# Altium footprint library General.PcbLib: 446 footprints (part 11 of 28)
Each footprint in its own frame and in the unit in brackets; x right, y up, seen from the top. Pads: shape width x height; smd on the part's side, far side on the other; paste and mask are expansions set on the pad; w line width, h text height; cw(c..) or ccw(c..) is an arc to the next point about the centre after c.
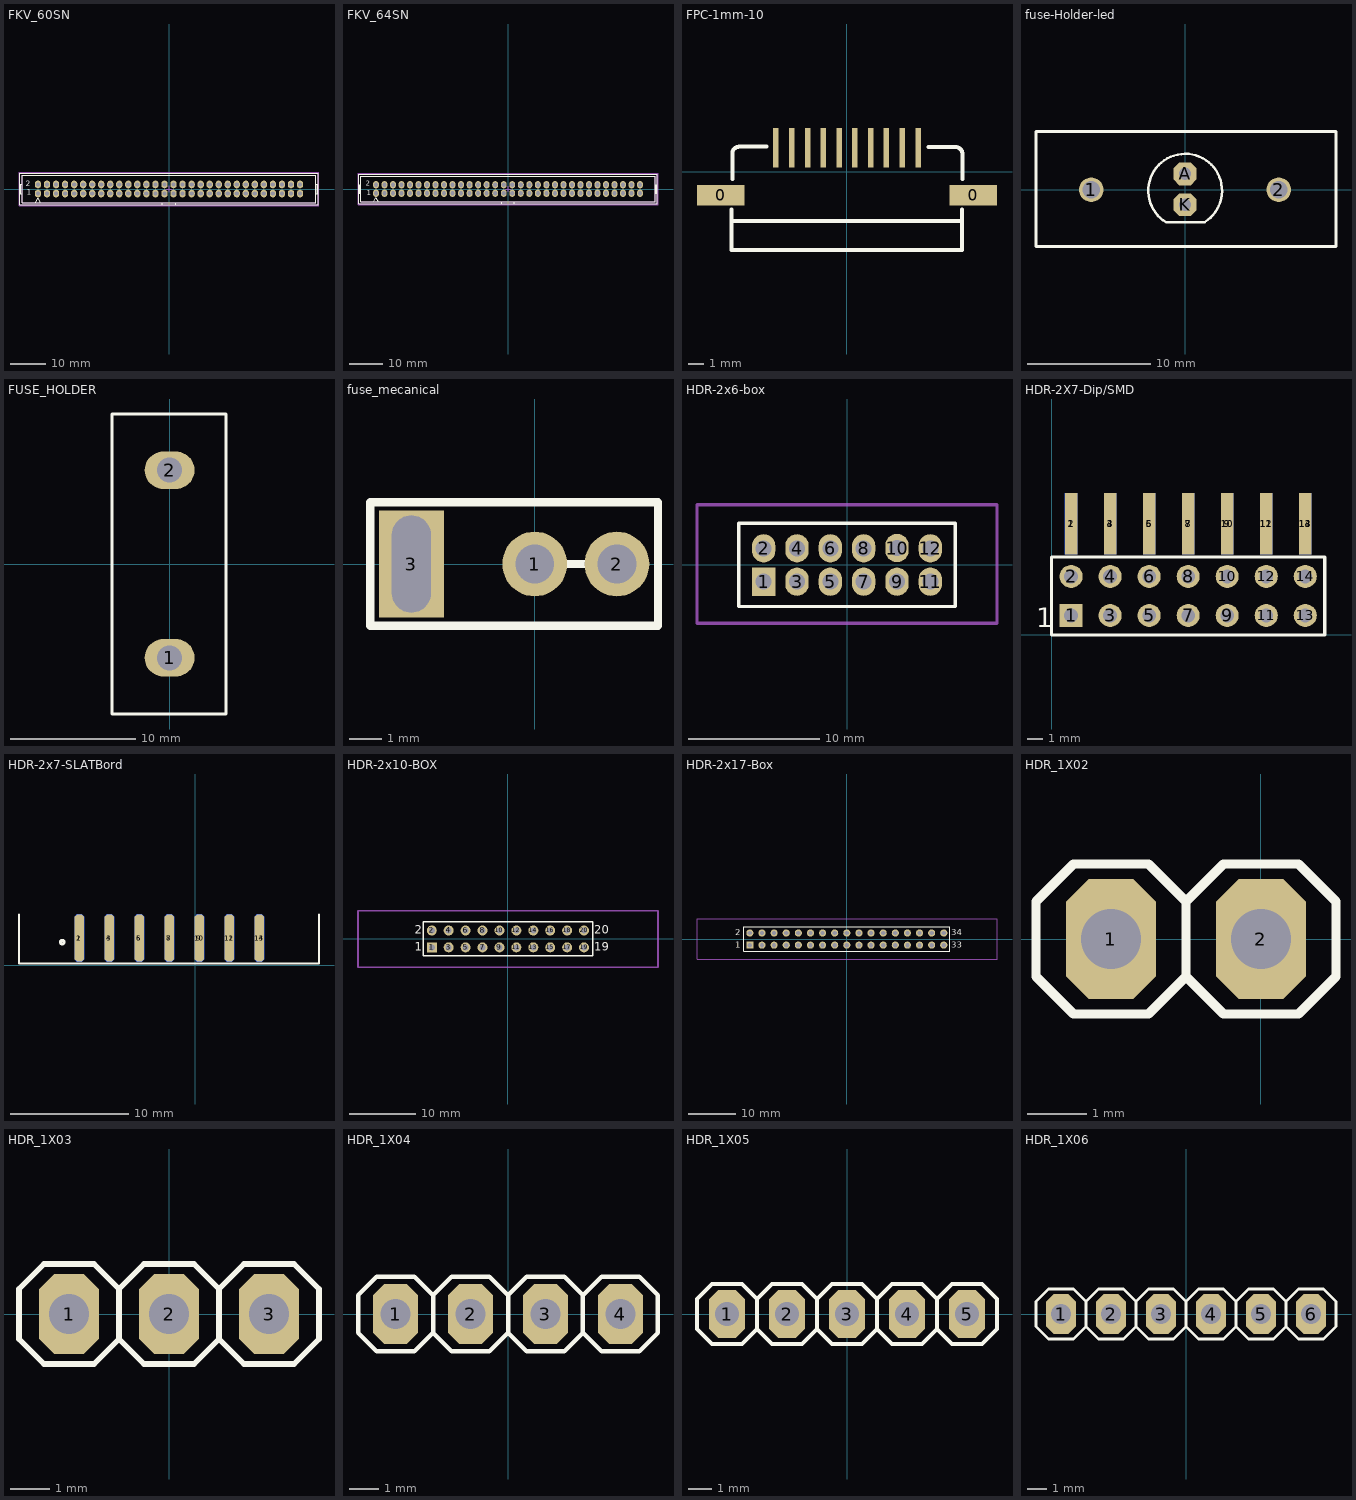
[diagram p10: the footprints below, top view; thin cyan lines are the x and y axes]

## FKV_60SN [mil] "Connector; BoxHeader; 30x2 Position ,2.54mm Pitch"
height 346.46
pads (60):
  oval 70x85 hole 48: 1(-1450,-50) 2(-1450,50) 3(-1350,-50) 4(-1350,50) 5(-1250,-50) 6(-1250,50) 7(-1150,-50) 8(-1150,50) 9(-1050,-50) 10(-1050,50) 11(-950,-50) 12(-950,50) 13(-850,-50) 14(-850,50) 15(-750,-50) 16(-750,50) 17(-650,-50) 18(-650,50) 19(-550,-50) 20(-550,50) 21(-450,-50) 22(-450,50) 23(-350,-50) 24(-350,50) 25(-250,-50) 26(-250,50) 27(-150,-50) 28(-150,50) 29(-50,-50) 30(-50,50) 31(50,-50) 32(50,50) 33(150,-50) 34(150,50) 35(250,-50) 36(250,50) 37(350,-50) 38(350,50) 39(450,-50) 40(450,50) 41(550,-50) 42(550,50) 43(650,-50) 44(650,50) 45(750,-50) 46(750,50) 47(850,-50) 48(850,50) 49(950,-50) 50(950,50) 51(1050,-50) 52(1050,50) 53(1150,-50) 54(1150,50) 55(1250,-50) 56(1250,50) 57(1350,-50) 58(1350,50) 59(1450,-50) 60(1450,50)
Top Overlay:
  lines w8: -1650,-50 -1625,-50 ; -1650,50 -1625,50 ; -1641.67,-50 -1641.67,50 ; -1475,-150 -1450,-100 -1425,-150 ; -75,-175 -75,-150 ; 75,-175 75,-150 ; 1625,-50 1650,-50 ; 1625,50 1650,50 ; 1641.67,-50 1641.67,50 ; -75,-150 75,-150 ; -75,-150 -1625,-150 -1625,150 1625,150 1625,-150 75,-150 ; -1650,-175 1650,-175 1650,175 -1650,175 -1650,-175
  text "1" at -1576,-66 h60
  text "2" at -1585,32 h60
Mechanical 13:
  drawing of 492 lines, arcs and shapes, not listed
Mechanical 15:
  lines w3.94: -35,0 0,0 ; 0,-35 0,0 ; 0,35 0,0 ; 35,0 0,0 ; -1660,-185 -1660,185 1660,185 1660,-185 -1660,-185
3D body: height 314.96, standoff -129.92, extent 1037.52,-62.48 1062.48,-37.52
3D body: height 314.96, standoff -129.92, extent 1137.52,-62.48 1162.48,-37.52
3D body: height 314.96, standoff -129.92, extent 1137.52,37.52 1162.48,62.48
3D body: height 314.96, standoff -129.92, extent 1037.52,37.52 1062.48,62.48
3D body: height 314.96, standoff -129.92, extent 1237.52,-62.48 1262.48,-37.52
3D body: height 314.96, standoff -129.92, extent 1337.52,-62.48 1362.48,-37.52
3D body: height 314.96, standoff -129.92, extent 1337.52,37.52 1362.48,62.48
3D body: height 314.96, standoff -129.92, extent 1237.52,37.52 1262.48,62.48
3D body: height 314.96, standoff -129.92, extent 1437.52,-62.48 1462.48,-37.52
3D body: height 314.96, standoff -129.92, extent 1437.52,37.52 1462.48,62.48
3D body: height 314.96, standoff -129.92, extent 537.52,-62.48 562.48,-37.52
3D body: height 314.96, standoff -129.92, extent 637.52,-62.48 662.48,-37.52
3D body: height 314.96, standoff -129.92, extent 637.52,37.52 662.48,62.48
3D body: height 314.96, standoff -129.92, extent 537.52,37.52 562.48,62.48
3D body: height 314.96, standoff -129.92, extent 737.52,-62.48 762.48,-37.52
3D body: height 314.96, standoff -129.92, extent 837.52,-62.48 862.48,-37.52
3D body: height 314.96, standoff -129.92, extent 837.52,37.52 862.48,62.48
3D body: height 314.96, standoff -129.92, extent 737.52,37.52 762.48,62.48
3D body: height 314.96, standoff -129.92, extent 937.52,-62.48 962.48,-37.52
3D body: height 314.96, standoff -129.92, extent 937.52,37.52 962.48,62.48
3D body: height 314.96, standoff -129.92, extent 37.52,-62.48 62.48,-37.52
3D body: height 314.96, standoff -129.92, extent 137.52,-62.48 162.48,-37.52
3D body: height 314.96, standoff -129.92, extent 137.52,37.52 162.48,62.48
3D body: height 314.96, standoff -129.92, extent 37.52,37.52 62.48,62.48
3D body: height 314.96, standoff -129.92, extent 237.52,-62.48 262.48,-37.52
3D body: height 314.96, standoff -129.92, extent 337.52,-62.48 362.48,-37.52
3D body: height 314.96, standoff -129.92, extent 337.52,37.52 362.48,62.48
3D body: height 314.96, standoff -129.92, extent 237.52,37.52 262.48,62.48
3D body: height 314.96, standoff -129.92, extent 437.52,-62.48 462.48,-37.52
3D body: height 314.96, standoff -129.92, extent 437.52,37.52 462.48,62.48
3D body: height 314.96, standoff -129.92, extent -462.48,-62.48 -437.52,-37.52
3D body: height 314.96, standoff -129.92, extent -362.48,-62.48 -337.52,-37.52
3D body: height 314.96, standoff -129.92, extent -362.48,37.52 -337.52,62.48
3D body: height 314.96, standoff -129.92, extent -462.48,37.52 -437.52,62.48
3D body: height 314.96, standoff -129.92, extent -262.48,-62.48 -237.52,-37.52
3D body: height 314.96, standoff -129.92, extent -162.48,-62.48 -137.52,-37.52
3D body: height 314.96, standoff -129.92, extent -162.48,37.52 -137.52,62.48
3D body: height 314.96, standoff -129.92, extent -262.48,37.52 -237.52,62.48
3D body: height 314.96, standoff -129.92, extent -62.48,-62.48 -37.52,-37.52
3D body: height 314.96, standoff -129.92, extent -62.48,37.52 -37.52,62.48
3D body: height 314.96, standoff -129.92, extent -962.48,-62.48 -937.52,-37.52
3D body: height 314.96, standoff -129.92, extent -862.48,-62.48 -837.52,-37.52
3D body: height 314.96, standoff -129.92, extent -862.48,37.52 -837.52,62.48
3D body: height 314.96, standoff -129.92, extent -962.48,37.52 -937.52,62.48
3D body: height 314.96, standoff -129.92, extent -762.48,-62.48 -737.52,-37.52
3D body: height 314.96, standoff -129.92, extent -662.48,-62.48 -637.52,-37.52
3D body: height 314.96, standoff -129.92, extent -662.48,37.52 -637.52,62.48
3D body: height 314.96, standoff -129.92, extent -762.48,37.52 -737.52,62.48
3D body: height 314.96, standoff -129.92, extent -562.48,-62.48 -537.52,-37.52
3D body: height 314.96, standoff -129.92, extent -562.48,37.52 -537.52,62.48
3D body: height 314.96, standoff -129.92, extent -1462.48,-62.48 -1437.52,-37.52
3D body: height 314.96, standoff -129.92, extent -1362.48,-62.48 -1337.52,-37.52
3D body: height 314.96, standoff -129.92, extent -1362.48,37.52 -1337.52,62.48
3D body: height 314.96, standoff -129.92, extent -1462.48,37.52 -1437.52,62.48
3D body: height 314.96, standoff -129.92, extent -1262.48,-62.48 -1237.52,-37.52
3D body: height 314.96, standoff -129.92, extent -1162.48,-62.48 -1137.52,-37.52
3D body: height 314.96, standoff -129.92, extent -1162.48,37.52 -1137.52,62.48
3D body: height 314.96, standoff -129.92, extent -1262.48,37.52 -1237.52,62.48
3D body: height 314.96, standoff -129.92, extent -1062.48,-62.48 -1037.52,-37.52
3D body: height 314.96, standoff -129.92, extent -1062.48,37.52 -1037.52,62.48
3D body: height 346.46, standoff 0, extent -1649.98,-174.98 1649.98,174.98
3D body: height 78.74, standoff 0, extent -1624.98,-149.98 1624.98,149.98
3D body: height 118.11, standoff 0, extent -74.98,-174.98 74.98,-150.02

## FKV_64SN [mil] "Connector; BoxHeader; 32x2 Position ,2.54mm Pitch"
height 346.46
pads (64):
  oval 70x85 hole 48: 1(-1550,-50) 2(-1550,50) 3(-1450,-50) 4(-1450,50) 5(-1350,-50) 6(-1350,50) 7(-1250,-50) 8(-1250,50) 9(-1150,-50) 10(-1150,50) 11(-1050,-50) 12(-1050,50) 13(-950,-50) 14(-950,50) 15(-850,-50) 16(-850,50) 17(-750,-50) 18(-750,50) 19(-650,-50) 20(-650,50) 21(-550,-50) 22(-550,50) 23(-450,-50) 24(-450,50) 25(-350,-50) 26(-350,50) 27(-250,-50) 28(-250,50) 29(-150,-50) 30(-150,50) 31(-50,-50) 32(-50,50) 33(50,-50) 34(50,50) 35(150,-50) 36(150,50) 37(250,-50) 38(250,50) 39(350,-50) 40(350,50) 41(450,-50) 42(450,50) 43(550,-50) 44(550,50) 45(650,-50) 46(650,50) 47(750,-50) 48(750,50) 49(850,-50) 50(850,50) 51(950,-50) 52(950,50) 53(1050,-50) 54(1050,50) 55(1150,-50) 56(1150,50) 57(1250,-50) 58(1250,50) 59(1350,-50) 60(1350,50) 61(1450,-50) 62(1450,50) 63(1550,-50) 64(1550,50)
Top Overlay:
  lines w8: -1750,-50 -1725,-50 ; -1750,50 -1725,50 ; -1741.67,-50 -1741.67,50 ; -1575,-150 -1550,-100 -1525,-150 ; -75,-175 -75,-150 ; 75,-175 75,-150 ; 1725,-50 1750,-50 ; 1725,50 1750,50 ; 1741.67,-50 1741.67,50 ; -75,-150 -1725,-150 -1725,150 1725,150 1725,-150 75,-150 ; -75,-150 75,-150 ; -1750,-175 -1750,175 1750,175 1750,-175 -1750,-175
  text "2" at -1669,41 h60
  text "1" at -1660,-76 h60
Mechanical 13:
  drawing of 524 lines, arcs and shapes, not listed
Mechanical 15:
  lines w3.94: -30,0 0,0 ; 0,-30 0,0 ; 0,30 0,0 ; 30,0 0,0 ; -1760,-185 1760,-185 1760,185 -1760,185 -1760,-185
3D body: height 118.11, standoff 0, extent -74.98,-174.98 74.98,-150.02
3D body: height 78.74, standoff 0, extent -1724.98,-149.98 1724.98,149.98
3D body: height 346.46, standoff 0, extent -1749.98,-174.98 1749.98,174.98
3D body: height 314.96, standoff -129.92, extent -1562.48,-62.48 -1537.52,-37.52
3D body: height 314.96, standoff -129.92, extent -1462.48,-62.48 -1437.52,-37.52
3D body: height 314.96, standoff -129.92, extent -1462.48,37.52 -1437.52,62.48
3D body: height 314.96, standoff -129.92, extent -1562.48,37.52 -1537.52,62.48
3D body: height 314.96, standoff -129.92, extent -1362.48,-62.48 -1337.52,-37.52
3D body: height 314.96, standoff -129.92, extent -1262.48,-62.48 -1237.52,-37.52
3D body: height 314.96, standoff -129.92, extent -1262.48,37.52 -1237.52,62.48
3D body: height 314.96, standoff -129.92, extent -1362.48,37.52 -1337.52,62.48
3D body: height 314.96, standoff -129.92, extent -1162.48,-62.48 -1137.52,-37.52
3D body: height 314.96, standoff -129.92, extent -1062.48,-62.48 -1037.52,-37.52
3D body: height 314.96, standoff -129.92, extent -1062.48,37.52 -1037.52,62.48
3D body: height 314.96, standoff -129.92, extent -1162.48,37.52 -1137.52,62.48
3D body: height 314.96, standoff -129.92, extent -962.48,-62.48 -937.52,-37.52
3D body: height 314.96, standoff -129.92, extent -862.48,-62.48 -837.52,-37.52
3D body: height 314.96, standoff -129.92, extent -862.48,37.52 -837.52,62.48
3D body: height 314.96, standoff -129.92, extent -962.48,37.52 -937.52,62.48
3D body: height 314.96, standoff -129.92, extent -762.48,-62.48 -737.52,-37.52
3D body: height 314.96, standoff -129.92, extent -662.48,-62.48 -637.52,-37.52
3D body: height 314.96, standoff -129.92, extent -662.48,37.52 -637.52,62.48
3D body: height 314.96, standoff -129.92, extent -762.48,37.52 -737.52,62.48
3D body: height 314.96, standoff -129.92, extent -562.48,-62.48 -537.52,-37.52
3D body: height 314.96, standoff -129.92, extent -462.48,-62.48 -437.52,-37.52
3D body: height 314.96, standoff -129.92, extent -462.48,37.52 -437.52,62.48
3D body: height 314.96, standoff -129.92, extent -562.48,37.52 -537.52,62.48
3D body: height 314.96, standoff -129.92, extent -362.48,-62.48 -337.52,-37.52
3D body: height 314.96, standoff -129.92, extent -262.48,-62.48 -237.52,-37.52
3D body: height 314.96, standoff -129.92, extent -262.48,37.52 -237.52,62.48
3D body: height 314.96, standoff -129.92, extent -362.48,37.52 -337.52,62.48
3D body: height 314.96, standoff -129.92, extent -162.48,-62.48 -137.52,-37.52
3D body: height 314.96, standoff -129.92, extent -62.48,-62.48 -37.52,-37.52
3D body: height 314.96, standoff -129.92, extent -62.48,37.52 -37.52,62.48
3D body: height 314.96, standoff -129.92, extent -162.48,37.52 -137.52,62.48
3D body: height 314.96, standoff -129.92, extent 37.52,-62.48 62.48,-37.52
3D body: height 314.96, standoff -129.92, extent 137.52,-62.48 162.48,-37.52
3D body: height 314.96, standoff -129.92, extent 137.52,37.52 162.48,62.48
3D body: height 314.96, standoff -129.92, extent 37.52,37.52 62.48,62.48
3D body: height 314.96, standoff -129.92, extent 237.52,-62.48 262.48,-37.52
3D body: height 314.96, standoff -129.92, extent 337.52,-62.48 362.48,-37.52
3D body: height 314.96, standoff -129.92, extent 337.52,37.52 362.48,62.48
3D body: height 314.96, standoff -129.92, extent 237.52,37.52 262.48,62.48
3D body: height 314.96, standoff -129.92, extent 437.52,-62.48 462.48,-37.52
3D body: height 314.96, standoff -129.92, extent 537.52,-62.48 562.48,-37.52
3D body: height 314.96, standoff -129.92, extent 537.52,37.52 562.48,62.48
3D body: height 314.96, standoff -129.92, extent 437.52,37.52 462.48,62.48
3D body: height 314.96, standoff -129.92, extent 637.52,-62.48 662.48,-37.52
3D body: height 314.96, standoff -129.92, extent 737.52,-62.48 762.48,-37.52
3D body: height 314.96, standoff -129.92, extent 737.52,37.52 762.48,62.48
3D body: height 314.96, standoff -129.92, extent 637.52,37.52 662.48,62.48
3D body: height 314.96, standoff -129.92, extent 837.52,-62.48 862.48,-37.52
3D body: height 314.96, standoff -129.92, extent 937.52,-62.48 962.48,-37.52
3D body: height 314.96, standoff -129.92, extent 937.52,37.52 962.48,62.48
3D body: height 314.96, standoff -129.92, extent 837.52,37.52 862.48,62.48
3D body: height 314.96, standoff -129.92, extent 1037.52,-62.48 1062.48,-37.52
3D body: height 314.96, standoff -129.92, extent 1137.52,-62.48 1162.48,-37.52
3D body: height 314.96, standoff -129.92, extent 1137.52,37.52 1162.48,62.48
3D body: height 314.96, standoff -129.92, extent 1037.52,37.52 1062.48,62.48
3D body: height 314.96, standoff -129.92, extent 1237.52,-62.48 1262.48,-37.52
3D body: height 314.96, standoff -129.92, extent 1337.52,-62.48 1362.48,-37.52
3D body: height 314.96, standoff -129.92, extent 1337.52,37.52 1362.48,62.48
3D body: height 314.96, standoff -129.92, extent 1237.52,37.52 1262.48,62.48
3D body: height 314.96, standoff -129.92, extent 1437.52,-62.48 1462.48,-37.52
3D body: height 314.96, standoff -129.92, extent 1537.52,-62.48 1562.48,-37.52
3D body: height 314.96, standoff -129.92, extent 1537.52,37.52 1562.48,62.48
3D body: height 314.96, standoff -129.92, extent 1437.52,37.52 1462.48,62.48

## FPC-1mm-10 [mm]
pads (12):
  rect 3x1.3 smd: 0(-8,-1.5) 0(8,-1.5)
  rect 0.35x2.5 smd: 1(-4.5,1.5) 2(-3.5,1.5) 3(-2.5,1.5) 4(-1.5,1.5) 5(-0.5,1.5) 6(0.5,1.5) 7(1.5,1.5) 8(2.5,1.5) 9(3.5,1.5) 10(4.5,1.5)
Top Overlay:
  lines w0.254: -7.315,-3.124 7.29,-3.124 ; -7.315,-2.413 -7.315,-4.953 7.29,-4.953 7.29,-2.413 ; -7.264,-0.457 -7.264,1.143 cw(c-6.833,1.143) -6.833,1.575 -5.105,1.575 ; 5.156,1.549 6.883,1.549 cw(c6.883,1.118) 7.315,1.118 7.315,-0.483
3D body "fpc-10-100-shb-t.stp": height 2.3, standoff 0.05, extent -7.304,-4.954 7.296,1.545

## fuse-Holder-led [mm] "with led"
pads (4):
  round 2 hole 1.4: 1(-7.62,0) 2(7.62,0)
  oct 1.85x1.85 hole 1: A(0,1.292) K(0,-1.208)
Top Overlay:
  lines w0.2: -1.543,-2.639 1.599,-2.621 ccw(c0.01,-0.077) -1.535,-2.648
  lines w0.254: -12.116,-4.623 12.268,-4.623 12.268,4.75 -12.116,4.75 -12.116,-4.623
3D body "Fuse-Holder.stp": height 14, standoff -3, extent -12.098,-4.648 12.302,4.752

## FUSE_HOLDER [mm]
pads (2):
  oval 4x3 hole 2: 1(0,-7.5) 2(0,7.5)
Top Overlay:
  lines w0.254: -4.6,-12 4.5,-12 4.5,12 -4.6,12 -4.6,-12
3D body "SW3dPS-part 8.STEP": height 12.96, standoff -2.9, extent -4.606,-12.031 4.476,11.969

## fuse_mecanical [mm]
pads (3):
  round 2 hole 1.2: 1(0,0) 2(2.54,0)
  rect 2x3.3 hole 1.2 slot 3 at 90 deg: 3(-3.81,0)
Top Overlay:
  lines w0.254: 0,0 2.54,0 ; -5.08,-1.905 -5.08,1.905 3.81,1.905 3.81,-1.905 -5.08,-1.905
3D body "1W right 100mil.step": height 14.83, standoff -2.23, extent -1.736,-1.905 3.006,1.895

## HDR-2x6-box [mil]
pads (12):
  rect 70x85 hole 48: 1(-250,-50.5)
  oval 70x85 hole 48: 2(-250,49.5) 3(-150,-50.5) 4(-150,49.5) 5(-50,-50.5) 6(-50,49.5) 7(50,-50.5) 8(50,49.5) 9(150,-50.5) 10(150,50.5) 11(250,-50.5) 12(250,49.5)
Top Overlay:
  lines w10: -325,-125 325,-125 325,125 -325,125 -325,-125
Mechanical 13:
  lines w3.94: -270,-70.5 -230,-70.5 -230,-30.5 -270,-30.5 -270,-70.5 ; -270,29.5 -270,69.5 -230,69.5 -230,29.5 -270,29.5 ; -170,-70.5 -170,-30.5 -130,-30.5 -130,-70.5 -170,-70.5 ; -170,29.5 -170,69.5 -130,69.5 -130,29.5 -170,29.5 ; -70,-70.5 -30,-70.5 -30,-30.5 -70,-30.5 -70,-70.5 ; -70,29.5 -70,69.5 -30,69.5 -30,29.5 -70,29.5 ; 30,-70.5 30,-30.5 70,-30.5 70,-70.5 30,-70.5 ; 30,29.5 30,69.5 70,69.5 70,29.5 30,29.5 ; 130,-70.5 170,-70.5 170,-30.5 130,-30.5 130,-70.5 ; 130,29.5 130,69.5 170,69.5 170,29.5 130,29.5 ; 230,-70.5 230,-30.5 270,-30.5 270,-70.5 230,-70.5 ; 230,29.5 230,69.5 270,69.5 270,29.5 230,29.5
Mechanical 15:
  lines w10: -450,-175 -450,180 450,180 450,-175 -450,-175
3D body "HeaderBox12.STEP": height 358.27, standoff -118.11, extent -448,-175.77 452,182.5

## HDR-2X7-Dip/SMD [mm] "Connector; Header; 7x2 Position"
pads (28):
  rect 1.5x1.5 hole 0.9: 1(1.27,1.257)
  rect 0.8x4 smd: 1(1.27,7.226) 3(3.81,7.226) 5(6.35,7.226) 7(8.89,7.226) 9(11.43,7.226) 11(13.97,7.226) 13(16.51,7.226)
  round 1.5 hole 0.9: 2(1.27,3.797) 3(3.81,1.257) 4(3.81,3.797) 5(6.35,1.257) 6(6.35,3.797) 7(8.89,1.257) 8(8.89,3.797) 9(11.43,1.257) 10(11.43,3.797) 11(13.97,1.257) 12(13.97,3.797) 13(16.51,1.257) 14(16.51,3.797)
  rect 0.8x4 smd far side: 2(1.27,7.226) 4(3.81,7.226) 6(6.35,7.226) 8(8.89,7.226) 10(11.43,7.226) 12(13.97,7.226) 14(16.51,7.226)
Top Overlay:
  lines w0.2: 0,-0.013 17.78,-0.013 17.78,5.067 0,5.067 0,-0.013
  text "1" at -1.016,0.495 h1.27

## HDR-2x7-SLATBord [mm]
pads (14):
  oct 0.8x4 smd: 1(-9.804,2.299) 3(-7.264,2.299) 5(-4.724,2.299) 7(-2.184,2.299) 9(0.356,2.299) 11(2.896,2.299) 13(5.436,2.299)
  oct 0.8x4 smd far side: 2(-9.804,2.299) 4(-7.264,2.299) 6(-4.724,2.299) 8(-2.184,2.299) 10(0.356,2.299) 12(2.896,2.299) 14(5.436,2.299)
Top Overlay:
  circle w0.254: c-11.252,1.956 r0.152
  lines w0.2: -14.91,4.293 -14.91,0.14 10.49,0.14 10.49,4.293
3D body "6251.stp": height 2.97, standoff -6.08, extent -11.049,-0.082 6.731,13.767

## HDR-2x10-BOX [mm]
pads (20):
  rect 1.5x1.5 hole 0.9: 1(-11.43,-1.27)
  round 1.5 hole 0.9: 2(-11.43,1.27) 3(-8.89,-1.27) 4(-8.89,1.27) 5(-6.35,-1.27) 6(-6.35,1.27) 7(-3.81,-1.27) 8(-3.81,1.27) 9(-1.27,-1.27) 10(-1.27,1.27) 11(1.27,-1.27) 12(1.27,1.27) 13(3.81,-1.27) 14(3.81,1.27) 15(6.35,-1.27) 16(6.35,1.27) 17(8.89,-1.27) 18(8.89,1.27) 19(11.43,-1.27) 20(11.43,1.27)
Top Overlay:
  lines w0.2: -12.7,-2.54 -10.795,-2.54 12.7,-2.54 12.7,2.54 -10.795,2.54 -12.7,2.54 -12.7,-2.54
  text "20" at 12.954,0.762 h1.27
  text "19" at 12.954,-1.778 h1.27
  text "1" at -13.97,-1.778 h1.27
  text "2" at -13.97,0.762 h1.27
Mechanical 15:
  lines w0.254: -22.504,-4.267 22.53,-4.267 22.53,4.242 -22.504,4.242 -22.504,-4.267
3D body "IDC2x17.stp": height 23.39, standoff -3.11, extent -22.494,-4.267 22.506,4.233

## HDR-2x17-Box [mm]
pads (34):
  rect 1.5x1.5 hole 0.9: 1(-20.32,-1.27)
  round 1.5 hole 0.9: 2(-20.32,1.27) 3(-17.78,-1.27) 4(-17.78,1.27) 5(-15.24,-1.27) 6(-15.24,1.27) 7(-12.7,-1.27) 8(-12.7,1.27) 9(-10.16,-1.27) 10(-10.16,1.27) 11(-7.62,-1.27) 12(-7.62,1.27) 13(-5.08,-1.27) 14(-5.08,1.27) 15(-2.54,-1.27) 16(-2.54,1.27) 17(0,-1.27) 18(0,1.27) 19(2.54,-1.27) 20(2.54,1.27) 21(5.08,-1.27) 22(5.08,1.27) 23(7.62,-1.27) 24(7.62,1.27) 25(10.16,-1.27) 26(10.16,1.27) 27(12.7,-1.27) 28(12.7,1.27) 29(15.24,-1.27) 30(15.24,1.27) 31(17.78,-1.27) 32(17.78,1.27) 33(20.32,-1.27) 34(20.32,1.27)
Top Overlay:
  lines w0.2: -21.59,-2.54 -21.59,2.54 21.59,2.54 21.59,-2.54 -21.59,-2.54
  text "2" at -23.368,0.762 h1.27
  text "1" at -23.368,-1.778 h1.27
  text "33" at 21.844,-1.778 h1.27
  text "34" at 21.844,0.762 h1.27
Mechanical 15:
  lines w0.254: -31.394,-4.242 -31.394,4.267 31.471,4.267 31.471,-4.242 -31.344,-4.242 -31.394,-4.242
3D body "IDC2x10.stp": height 23.39, standoff -3.11, extent -31.406,-4.275 31.394,4.225

## HDR_1X02 [mil]
pads (2):
  oct 60x80 hole 40: 1(-100,0) 2(0,0)
Top Overlay:
  rectangle: -10,-10 10,10
  rectangle: -110,-10 -90,10
  lines w6: -50,-25 -50,25 ; -50,-25 -75,-50 -125,-50 -150,-25 -150,25 -125,50 -75,50 -50,25 ; -50,-25 -25,-50 25,-50 50,-25 50,25 25,50 -25,50 -50,25
3D body "User Library-Header Vertical 2_54mm Pitch2-12 Way.STEP": height 233.86, standoff -115.75, extent -149.21,-51.18 50.79,48.82

## HDR_1X03 [mil]
pads (3):
  oct 60x80 hole 40: 1(-100,0) 2(0,0) 3(100,0)
Top Overlay:
  rectangle: -10,-10 10,10
  rectangle: -110,-10 -90,10
  rectangle: 90,-10 110,10
  lines w6: -50,-25 -50,25 ; -50,-25 -75,-50 -125,-50 -150,-25 -150,25 -125,50 -75,50 -50,25 ; -50,-25 -25,-50 25,-50 50,-25 ; -50,25 -25,50 25,50 50,25 ; 50,-25 50,25 ; 50,-25 75,-50 125,-50 150,-25 150,25 125,50 75,50 50,25
3D body "PinHeader 1X3.step": height 335.04, standoff -144.88, extent -151.97,-61.02 148.03,53.94

## HDR_1X04 [mil]
pads (4):
  oct 60x80 hole 40: 1(-150,0) 2(-50,0) 3(50,0) 4(150,0)
Top Overlay:
  rectangle: 140,-10 160,10
  rectangle: -160,-10 -140,10
  rectangle: -60,-10 -40,10
  rectangle: 40,-10 60,10
  lines w6: -100,-25 -75,-50 -25,-50 0,-25 ; -100,-25 -125,-50 -175,-50 -200,-25 -200,25 -175,50 -125,50 -100,25 ; -100,-25 -100,25 ; -100,25 -75,50 -25,50 0,25 ; 0,-25 0,25 ; 0,-25 25,-50 75,-50 100,-25 ; 0,25 25,50 75,50 100,25 ; 100,-25 125,-50 175,-50 200,-25 200,25 175,50 125,50 100,25 ; 100,-25 100,25
3D body "User Library-Header Vertical 2_54mm Pitch2-14 Way.STEP": height 233.86, standoff -115.75, extent -198.03,-49.21 201.97,50.79

## HDR_1X05 [mil]
pads (5):
  oct 60x80 hole 40: 1(-200,0) 2(-100,0) 3(0,0) 4(100,0) 5(200,0)
Top Overlay:
  rectangle: 90,-10 110,10
  rectangle: -10,-10 10,10
  rectangle: -110,-10 -90,10
  rectangle: -210,-10 -190,10
  rectangle: 190,-10 210,10
  lines w6: -150,-25 -150,25 ; -150,-25 -175,-50 -225,-50 -250,-25 -250,25 -225,50 -175,50 -150,25 ; -150,-25 -125,-50 -75,-50 -50,-25 ; -150,25 -125,50 -75,50 -50,25 ; -50,-25 -25,-50 25,-50 50,-25 ; -50,-25 -50,25 ; -50,25 -25,50 25,50 50,25 ; 50,-25 50,25 ; 50,-25 75,-50 125,-50 150,-25 ; 50,25 75,50 125,50 150,25 ; 150,-25 150,25 ; 150,-25 175,-50 225,-50 250,-25 250,25 225,50 175,50 150,25
3D body "PinHeader 1X5.step": height 335.04, standoff -144.88, extent -250,-59.06 250,55.91

## HDR_1X06 [mil]
pads (6):
  oct 60x80 hole 40: 1(-250,0) 2(-150,0) 3(-50,0) 4(50,0) 5(150,0) 6(250,0)
Top Overlay:
  rectangle: 140,-10 160,10
  rectangle: 40,-10 60,10
  rectangle: -60,-10 -40,10
  rectangle: -160,-10 -140,10
  rectangle: -260,-10 -240,10
  rectangle: 240,-10 260,10
  lines w6: -200,-25 -200,25 ; -200,-25 -225,-50 -275,-50 -300,-25 -300,25 -275,50 -225,50 -200,25 ; -200,-25 -175,-50 -125,-50 -100,-25 ; -200,25 -175,50 -125,50 -100,25 ; -100,-25 -75,-50 -25,-50 0,-25 ; -100,-25 -100,25 ; -100,25 -75,50 -25,50 0,25 ; 0,-25 0,25 ; 0,-25 25,-50 75,-50 100,-25 ; 0,25 25,50 75,50 100,25 ; 100,-25 100,25 ; 100,-25 125,-50 175,-50 200,-25 ; 100,25 125,50 175,50 200,25 ; 200,-25 200,25 ; 200,-25 225,-50 275,-50 300,-25 300,25 275,50 225,50 200,25
3D body "User Library-Header Vertical 2_54mm Pitch2-16 Way.STEP": height 233.86, standoff -115.75, extent -300,-51.18 300,48.82